# Altium footprint library mmyLibrary.PcbLib: 231 footprints (part 3 of 15)
Each footprint in its own frame and in the unit in brackets; x right, y up, seen from the top. Pads: shape width x height; smd on the part's side, far side on the other; paste and mask are expansions set on the pad; w line width, h text height; cw(c..) or ccw(c..) is an arc to the next point about the centre after c.
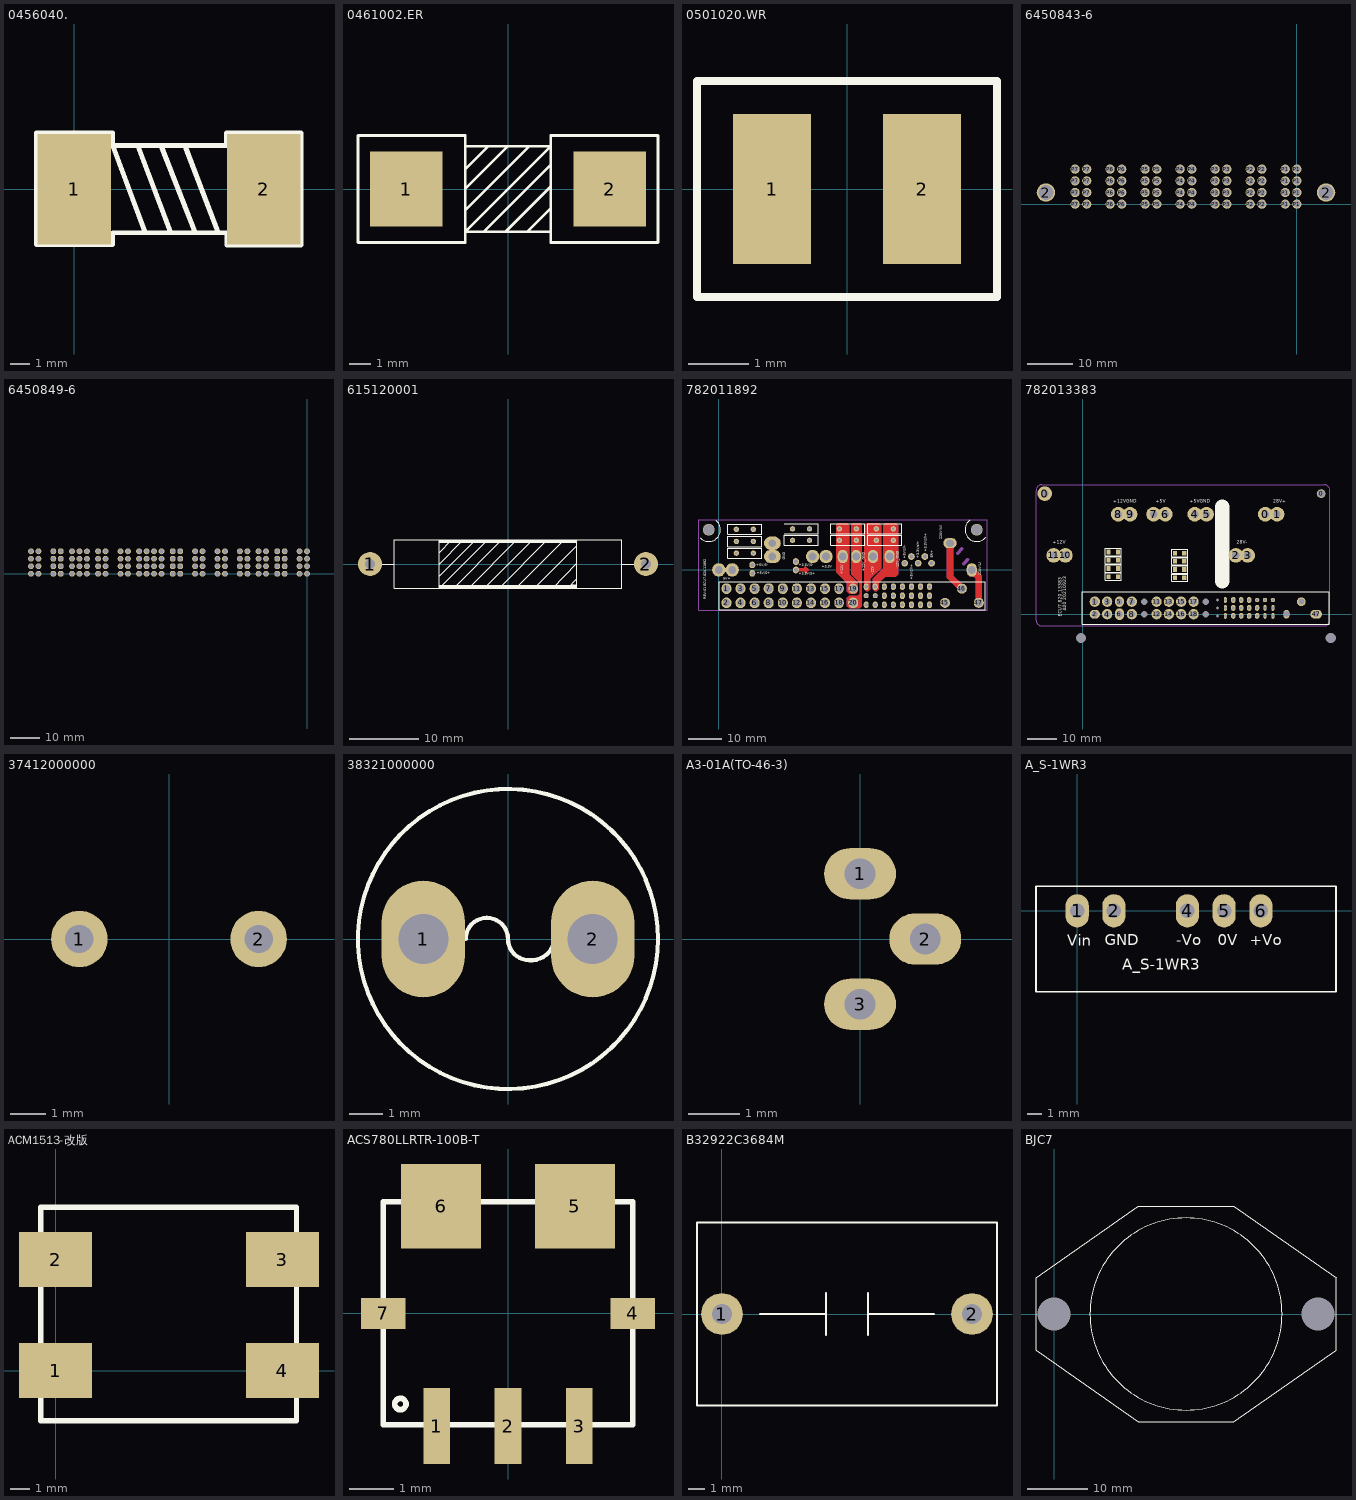
[diagram p2: the footprints below, top view; thin cyan lines are the x and y axes]

## 0456040. [mm]
pads (2):
  rect 3.8x5.7 smd: 1(0,0) 2(9.795,0)
Top Overlay:
  lines w0.254: 1.992,-2.268 1.992,-2.861 -1.958,-2.861 -1.958,2.916 1.992,2.916 1.992,2.25 ; 1.992,-2.25 7.447,-2.25 ; 3.285,2.25 4.981,-2.25 ; 3.679,-2.25 1.992,2.25 ; 4.485,2.25 6.252,-2.25 ; 5.774,2.105 7.447,-2.25 ; 1.992,2.25 7.861,2.25 7.861,2.916 11.718,2.916 11.718,-2.898 7.879,-2.898 7.879,-2.25 7.447,-2.25

## 0461002.ER [mm] "W10.1mm*L3.12mm*H3.12mm"
height 3.12
pads (2):
  rect 3.4x3.5 smd: 1(-4.75,0) 2(4.75,0)
Top Overlay:
  lines w0.127: -2,-1 1,2 ; -2,0 0,2 ; -2,0.9 -0.9,2 ; -2,2 2,2 -2,-2 2,-2 ; -1.143,-2 2,1.143 ; -0.127,-2 2,0.127 ; 0.889,-2 2,-0.889 ; -7,-2.5 -7,2.5 -2,2.5 -2,-2.5 -7,-2.5 ; 2,-2.5 2,2.5 7,2.5 7,-2.5 2,-2.5

## 0501020.WR [mm] "H3.2mm*W1.63mm*T0.835mm"
pads (2):
  rect 1.3x2.5 smd: 1(-1.25,0) 2(1.25,0)
Top Overlay:
  lines w0.127: -2.5,-1.8 -2.5,1.8 2.5,1.8 2.5,-1.8 -2.5,-1.8

## 6450843-6 [mm]
pads (58):
  round 4 hole 3.3: 2(-54.61,2.54) 2(6.35,2.54)
  round 2 hole 1.5: P1(-2.54,0) P1(-2.54,2.54) P1(-2.54,5.08) P1(-2.54,7.62) P1(0,0) P1(0,2.54) P1(0,5.08) P1(0,7.62) P2(-10.16,0) P2(-10.16,2.54) P2(-10.16,5.08) P2(-10.16,7.62) P2(-7.62,0) P2(-7.62,2.54) P2(-7.62,5.08) P2(-7.62,7.62) P3(-17.78,0) P3(-17.78,2.54) P3(-17.78,5.08) P3(-17.78,7.62) P3(-15.24,0) P3(-15.24,2.54) P3(-15.24,5.08) P3(-15.24,7.62) P4(-25.4,0) P4(-25.4,2.54) P4(-25.4,5.08) P4(-25.4,7.62) P4(-22.86,0) P4(-22.86,2.54) P4(-22.86,5.08) P4(-22.86,7.62) P5(-33.02,0) P5(-33.02,2.54) P5(-33.02,5.08) P5(-33.02,7.62) P5(-30.48,0) P5(-30.48,2.54) P5(-30.48,5.08) P5(-30.48,7.62) P6(-40.64,0) P6(-40.64,2.54) P6(-40.64,5.08) P6(-40.64,7.62) P6(-38.1,0) P6(-38.1,2.54) P6(-38.1,5.08) P6(-38.1,7.62) P7(-48.26,0) P7(-48.26,2.54) P7(-48.26,5.08) P7(-48.26,7.62) P7(-45.72,0) P7(-45.72,2.54) P7(-45.72,7.62) P7(-45.72,5.08)
Bottom Overlay:
  lines w0.254: -56.769,-5.08 -56.769,11.684 8.509,11.684 8.509,-5.08 -56.769,-5.08
  text "PCB" at 8.128,-4.572 h1.2

## 6450849-6 [mm]
pads (116):
  round 2 hole 1.5: 3(-80.01,2.54) 3(-80.01,5.08) 3(-77.47,2.54) 3(-77.47,5.08) 3(-74.93,2.54) 3(-74.93,5.08) 3(-57.15,2.54) 3(-57.15,5.08) 3(-54.61,2.54) 3(-54.61,5.08) 3(-52.07,2.54) 3(-52.07,5.08) 3(-49.53,2.54) 3(-49.53,5.08) 3(-16.51,2.54) 3(-16.51,5.08) 3(-13.97,2.54) 3(-13.97,5.08) A1(-13.97,0) A2(-16.51,0) A3(-49.53,0) A4(-52.07,0) A5(-54.61,0) A6(-57.15,0) A8(-77.47,0) A9(-80.01,0) D1(-13.97,7.62) D2(-16.51,7.62) D3(-49.53,7.62) D4(-52.07,7.62) D5(-54.61,7.62) D6(-57.15,7.62) D8(-77.47,7.62) D9(-80.01,7.62) P1(-2.54,0) P1(-2.54,2.54) P1(-2.54,5.08) P1(-2.54,7.62) P1(0,0) P1(0,2.54) P1(0,5.08) P1(0,7.62) P2(-10.16,0) P2(-10.16,2.54) P2(-10.16,5.08) P2(-10.16,7.62) P2(-7.62,0) P2(-7.62,2.54) P2(-7.62,5.08) P2(-7.62,7.62) P3(-22.86,0) P3(-22.86,2.54) P3(-22.86,5.08) P3(-22.86,7.62) P3(-20.32,0) P3(-20.32,2.54) P3(-20.32,5.08) P3(-20.32,7.62) P4(-30.48,0) P4(-30.48,2.54) P4(-30.48,5.08) P4(-30.48,7.62) P4(-27.94,0) P4(-27.94,2.54) P4(-27.94,5.08) P4(-27.94,7.62) P5(-38.1,0) P5(-38.1,2.54) P5(-38.1,5.08) P5(-38.1,7.62) P5(-35.56,0) P5(-35.56,2.54) P5(-35.56,5.08) P5(-35.56,7.62) P6(-45.72,0) P6(-45.72,2.54) P6(-45.72,5.08) P6(-45.72,7.62) P6(-43.18,0) P6(-43.18,2.54) P6(-43.18,5.08) P6(-43.18,7.62) P7(-63.5,0) P7(-63.5,2.54) P7(-63.5,5.08) P7(-63.5,7.62) P7(-60.96,0) P7(-60.96,2.54) P7(-60.96,5.08) P7(-60.96,7.62) P8(-71.12,0) P8(-71.12,2.54) P8(-71.12,5.08) P8(-71.12,7.62) P8(-68.58,0) P8(-68.58,2.54) P8(-68.58,5.08) P8(-68.58,7.62) P9(-86.36,5.08) P9(-86.36,0) P9(-86.36,2.54) P9(-86.36,7.62) P9(-83.82,0) P9(-83.82,2.54) P9(-83.82,5.08) P9(-83.82,7.62) P10(-93.98,5.08) P10(-93.98,7.62) P10(-93.98,0) P10(-93.98,2.54) P10(-91.44,2.54) P10(-91.44,5.08) P10(-91.44,0) P10(-91.44,7.62)
  oval 2x1.8 hole 1.5: A7(-74.93,0) D7(-74.93,7.62)
Bottom Overlay:
  lines w0.254: -98.044,-5.08 -98.044,11.684 4.064,11.684 4.064,-5.08 -98.044,-5.08
  text "P1" at -0.46,10.8 h1.5
  text "PCB" at 3.556,-4.572 h1.2

## 615120001 [mm] "6.35*32.5mm"
height 6.35
pads (2):
  round 3.5 hole 1.5: 1(-20,0) 2(20,0)
Top Overlay:
  rectangle: -10,-3.5 10,-3.048
  rectangle: 9.147,-3.5 10,-2.998
  rectangle: -10.033,3.048 10,3.5
  lines w0.127: -20,0 -16.5,0 ; -10,-1.778 -4.699,3.5 ; -10,0 -6.477,3.5 ; -10,1.651 -8.128,3.5 ; -10,3.373 -10,-3.5 -2.921,3.5 ; -7.874,-3.5 -0.889,3.5 ; -5.715,-3.5 1.27,3.5 ; -3.429,-3.5 3.556,3.5 ; -1.27,-3.5 5.715,3.5 ; 1.143,-3.5 8.128,3.5 ; 3.81,-3.5 10,2.667 ; 6.477,-3.5 10,0.127 ; 8.636,-3.5 10,-2.159 ; 10,-3.5 10,3.5 ; 16.5,0 20,0 ; -16.5,-3.5 -16.5,3.5 16.5,3.5 16.5,-3.5 -16.5,-3.5

## 782011892 [mm]
pads (88):
  oval 3x3.2 hole 2.2: 1(2.3,-5.58) 2(2.3,-9.83) 3(6.5,-5.58) 4(6.5,-9.83) 5(10.7,-5.58) 6(10.7,-9.83) 7(14.9,-5.58) 8(14.9,-9.83) 9(19.1,-5.58) 10(19.1,-9.83) 11(23.3,-5.58) 12(23.3,-9.83) 13(27.5,-5.58) 14(27.5,-9.83) 15(31.7,-5.58) 16(31.7,-9.83) 20(40.1,-9.83)
  round 1.6 hole 0.8: 1(10.325,5.015) 1(10.325,8.507) 1(10.325,12.127) 1(22.009,8.825) 1(22.009,12.254) 1(35.979,8.825) 1(35.979,12.254) 1(47.028,8.825) 1(47.028,12.254) 2(5.245,5.015) 2(5.245,8.507) 2(5.245,12.127) 2(27.089,8.825) 2(27.089,12.254) 2(41.059,8.825) 2(41.059,12.254) 2(52.108,8.825) 2(52.108,12.254)
  oval 2.8x3.2 hole 2.2: 17(35.9,-5.58) 18(35.9,-9.83)
  oval 2.8x3 hole 2.2: 19(40.1,-5.58)
  oval 1.5x2 hole 1: 21(44,-5) 23(44,-10.4) 24(46.7,-5) 26(46.7,-10.4) 27(49.4,-5) 28(49.4,-7.7) 29(49.4,-10.4) 30(52.1,-5) 31(52.1,-7.7) 32(52.1,-10.4) 33(54.8,-5) 34(54.8,-7.7) 35(54.8,-10.4) 36(57.5,-5) 37(57.5,-7.7) 38(57.5,-10.4) 39(60.2,-5) 40(60.2,-7.7) 41(60.2,-10.4) 42(62.9,-5) 43(62.9,-7.7) 44(62.9,-10.4)
  round 1.5 hole 1: 22(44,-7.7) 25(46.7,-7.7)
  round 3 hole 2.2: 45(67.5,-9.83) 46(72.55,-5.58) 47(77.6,-9.83)
  round 3.5 hole 3.2: ""(-3,12) ""(77,12)
  round 4 hole 2.3: ""(0,0) ""(4,0) ""(28,4) ""(32,4)
  oval 1.8x2 hole 1.2: ""(10,-1) ""(10,1.5) ""(23,0) ""(23,2.5)
  oval 5x4 hole 2.3: ""(16,4) ""(16,8)
  oval 3x4 hole 2.3: ""(37,4) ""(46,4) ""(51,4) ""(75.5,0)
  oval 2.8x4 hole 2.3: ""(41,4)
  round 2 hole 1.2: ""(55.5,2) ""(57.5,4) ""(59.5,2) ""(61.5,4) ""(63.5,2)
  oval 4x3 hole 2.3: ""(69,8)
Top Layer:
  region: 26.454,-0.75 25.556,0.148 25.107,-0.301 26.005,-1.199
  region: 25.413,-0.217 26.311,0.681 25.862,1.13 24.964,0.232
  region: 42.71,13.27 42.71,-10.86 42.075,-11.495 38.9,-11.495 38.265,-10.86 38.265,-8.32 38.9,-7.685 41.44,-7.685 42.075,-7.05 42.075,-3.875 39.535,-1.335 39.535,13.27 40.17,13.905 42.075,13.905
  region: 53.505,13.27 53.505,-1.335 52.87,-1.97 49.695,-1.97 47.79,-3.875 47.79,-5.78 47.155,-6.415 46.52,-6.415 45.885,-5.78 45.885,-2.605 49.06,0.57 49.06,13.27 49.695,13.905 52.87,13.905
  region: 38.9,13.27 38.9,-1.335 41.44,-3.875 41.44,-6.415 40.805,-7.05 38.9,-7.05 38.265,-6.415 38.265,-3.875 35.09,-0.7 35.09,13.27 35.725,13.905 38.265,13.905
  region: 48.425,13.27 48.425,0.57 45.25,-2.605 45.25,-5.78 44.615,-6.415 43.98,-6.415 43.345,-5.78 43.345,13.27 43.98,13.905 47.79,13.905
  lines w1: 23,0 26.491,0
  lines w2: 70,8 68.999,6.999 68.999,-2.029 72.55,-5.58 ; 75.5,-1 cw(c75.5,-3.414) 77.207,-1.707 ; 75.5,0 77.6,-2.1 77.6,-9.83
Mid-Layer 1:
  region: 24.808,-2.864 25.252,-2.419 24.803,-1.97 24.359,-2.415
  region: 42.71,-8.32 42.71,-10.86 42.075,-11.495 38.9,-11.495 38.265,-10.86 38.265,-8.32 38.9,-7.685 42.075,-7.685
  region: 41.44,-4.51 41.44,-6.415 40.805,-7.05 38.9,-7.05 38.265,-6.415 38.265,-4.51 38.9,-3.875 40.805,-3.875
  region: 53.505,13.27 53.505,-1.335 52.87,-1.97 49.695,-1.97 47.79,-3.875 47.79,-5.78 47.155,-6.415 46.52,-6.415 45.885,-5.78 45.885,-2.605 49.06,0.57 49.06,13.27 49.695,13.905 52.87,13.905
  region: 42.71,13.27 42.71,-0.7 42.075,-1.335 40.17,-1.335 39.535,-0.7 39.535,13.27 40.17,13.905 42.075,13.905
  region: 38.9,13.27 38.9,-0.7 38.265,-1.335 35.725,-1.335 35.09,-0.7 35.09,13.27 35.725,13.905 38.265,13.905
  region: 48.425,13.27 48.425,0.57 45.25,-2.605 45.25,-5.78 44.615,-6.415 43.98,-6.415 43.345,-5.78 43.345,13.27 43.98,13.905 47.79,13.905
  lines w0.5: 24.168,-2.224 40.78,-2.224 42.456,-3.9 42.456,-6.156 44,-7.7
  lines w1: 66.793,-9.123 ccw(c65.086,-7.416) 67.5,-7.416 ccw(c69.914,-7.416) 68.207,-9.123 ; 67.5,-9.83 67.5,-1.31 77,8.19 77,12 ; 76.116,11.116 cw(c73.982,8.982) 77,8.982 cw(c80.018,8.982) 77.884,11.116
Mid-Layer 2:
  region: 53.505,13.27 53.505,0.855 53.104,0.454 52.982,0.272 52.939,0.057 52.939,-1.901 52.87,-1.97 49.695,-1.97 47.79,-3.875 47.79,-5.78 47.155,-6.415 46.52,-6.415 45.885,-5.78 45.885,-2.605 49.06,0.57 49.06,13.27 49.695,13.905 52.87,13.905
  region: 42.71,13.27 42.71,-10.86 42.075,-11.495 38.9,-11.495 38.265,-10.86 38.265,-8.32 38.9,-7.685 41.44,-7.685 42.075,-7.05 42.075,-3.875 39.535,-1.335 39.535,13.27 40.17,13.905 42.075,13.905
  region: 38.9,13.27 38.9,-1.335 41.44,-3.875 41.44,-6.415 40.805,-7.05 38.9,-7.05 38.265,-6.415 38.265,-3.875 35.09,-0.7 35.09,13.27 35.725,13.905 38.265,13.905
  region: 48.425,13.27 48.425,0.57 45.25,-2.605 45.25,-5.78 44.615,-6.415 43.98,-6.415 43.345,-5.78 43.345,13.27 43.98,13.905 47.79,13.905
  lines w0.5: 53.52,-6.42 ccw(c54.8,-5.139) 54.8,-6.95 ; 54.122,0.679 cw(c55.5,-0.698) 55.5,1.25 ; 54.123,-7.023 cw(c53.697,-7.45) 54.3,-7.45 ; 54.26,0.817 ccw(c53.077,2) 54.75,2 ; 54.8,-10.4 56.172,-9.028 56.172,-2.097 57.442,-0.827 57.442,3.558 57,4 ; 54.8,-9.65 ccw(c54.8,-7.839) 56.08,-9.12 ; 54.8,-7.7 53.5,-6.4 53.5,0.057 55.471,2.028 ; 55.3,-10.15 cw(c55.904,-10.15) 55.477,-9.723 ; 56.97,3.47 cw(c55.829,2.329) 57.442,2.329 ; 57.442,2.049 cw(c59.451,2.049) 58.03,3.47 ; 58.839,-1.406 cw(c62.906,-1.406) 60.03,1.47 ; 58.839,-0.199 cw(c61.699,-0.199) 59.677,1.823 ; 58.839,1.008 cw(c60.492,1.008) 59.323,2.177 ; 58.92,-6.42 ccw(c60.2,-5.139) 60.2,-6.95 ; 59.5,2 58.839,1.339 58.839,-6.339 60.2,-7.7 ; 59.523,-7.023 cw(c59.097,-7.45) 59.7,-7.45 ; 60.2,-10.4 61.5,-9.1 61.5,4 ; 60.2,-9.65 ccw(c60.2,-7.839) 61.48,-9.12 ; 60.7,-10.15 cw(c61.304,-10.15) 60.877,-9.723 ; 60.97,3.47 cw(c59.689,2.189) 61.5,2.189 cw(c63.311,2.189) 62.03,3.47 ; 61.5,4 61.5,4
  lines w1: 62.723,-4.573 ccw(c60.848,-2.698) 63.5,-2.698 ; 62.9,-5 63.5,-4.4 63.5,2 ; 63.146,1.646 cw(c62.293,0.793) 63.5,0.793 cw(c64.707,0.793) 63.854,1.646
  lines w2: 70,8 68.999,6.999 68.999,-2.029 72.55,-5.58 ; 75.5,-1 cw(c75.5,-3.414) 77.207,-1.707 ; 75.5,0 77.6,-2.1 77.6,-9.83
Bottom Layer:
  region: 53.505,13.27 53.505,-1.335 52.87,-1.97 49.695,-1.97 47.79,-3.875 47.79,-5.78 47.155,-6.415 46.52,-6.415 45.885,-5.78 45.885,-2.605 49.06,0.57 49.06,13.27 49.695,13.905 52.87,13.905
  region: 42.71,13.27 42.71,-10.86 42.075,-11.495 38.9,-11.495 38.265,-10.86 38.265,-8.32 38.9,-7.685 41.44,-7.685 42.075,-7.05 42.075,-3.875 39.535,-1.335 39.535,13.27 40.17,13.905 42.075,13.905
  region: 38.9,13.27 38.9,-1.335 41.44,-3.875 41.44,-6.415 40.805,-7.05 38.9,-7.05 38.265,-6.415 38.265,-3.875 35.09,-0.7 35.09,13.27 35.725,13.905 38.265,13.905
  region: 48.425,13.27 48.425,0.57 45.25,-2.605 45.25,-5.78 44.615,-6.415 43.98,-6.415 43.345,-5.78 43.345,13.27 43.98,13.905 47.79,13.905
  lines w2: 70,8 68.999,6.999 68.999,-2.029 72.55,-5.58 ; 75.5,-1 cw(c75.5,-3.414) 77.207,-1.707 ; 75.5,0 77.6,-2.1 77.6,-9.83
Top Overlay:
  lines w0.254: -5.559,9.612 ccw(c-3,12) -0.718,14.654 ; 19.469,10.73 29.629,10.73 29.629,13.778 19.469,13.778 ; 74.941,14.831 ccw(c77,12) 79.733,9.814 ; 0.095,-11.93 0.095,-3.48 79.47,-3.48 79.47,-11.93 40.1,-11.93 36.29,-11.93 0.095,-11.93 ; 2.705,3.491 12.865,3.491 12.865,6.539 2.705,6.539 2.705,3.491 ; 2.705,6.983 12.865,6.983 12.865,10.031 2.705,10.031 2.705,6.983 ; 2.705,10.603 12.865,10.603 12.865,13.651 2.705,13.651 2.705,10.603 ; 19.469,7.301 29.629,7.301 29.629,10.349 19.469,10.349 19.469,7.301 ; 33.439,7.301 43.599,7.301 43.599,10.349 33.439,10.349 33.439,7.301 ; 33.439,10.73 43.599,10.73 43.599,13.778 33.439,13.778 33.439,10.73 ; 44.488,7.301 54.648,7.301 54.648,10.349 44.488,10.349 44.488,7.301 ; 44.488,10.73 54.648,10.73 54.648,13.778 44.488,13.778 44.488,10.73
  text "+5V/sh+" at 57.823,-2.884 h0.8
  text "+3.3V/sh+" at 62.014,5.371 h0.8
  text "+5V/sh-" at 55.791,3.339 h0.8
  text "+3.3V/sh-" at 59.855,3.466 h0.8
  text "+3.3V/S+" at 23.914,-1.487 h0.8
  text "+3.3V/S-" at 23.914,1.053 h0.8
  text "+5V/S-" at 11.214,1.053 h0.8
  text "+5V/S+" at 11.341,-1.36 h0.8
  text "REV:01 ECU7.820.11892" at -3.772,-8.726 h0.8
  text "-12V_GND" at 53.759,0.291 h0.8
  text "-12V" at 46.266,-1.36 h0.8
  text "+12V_GND" at 43.599,-0.344 h0.8
  text "+12V" at 37.122,-1.36 h0.8
  text "+3.3V" at 30.772,0.672 h0.8
  text "GND" at 19.85,3.085 h0.8
  text "5V+" at 1.308,-2.884 h0.8
  text "ER+" at 64.046,3.593 h0.8
  text "220V(N)" at 66.713,9.181 h0.8
  text "220V(L)" at 78.27,-1.614 h0.8
Bottom Overlay:
  text "ECU7.820.11892" at -3.772,7.149 h0.8
Bottom Solder:
  rectangle: 42.075,-7.964 42.71,-3.265
Mechanical 1:
  lines w0.254: -5.947,-11.964 -5.947,15.036 80.053,15.036 80.053,-11.964 -5.947,-11.964
  lines w1: 71.285,5.015 72.555,6.285 ; 73.063,1.84 74.333,3.11

## 782013383 [mm]
pads (79):
  round 5 hole 2.5: 0(-12.9,41) 0(62.1,34) 1(66.1,34) 2(52.1,20) 3(56.1,20) 4(38.1,34) 5(42.1,34) 6(28.1,34) 7(24.1,34) 8(12.1,34) 9(16.1,34) 10(-5.9,20) 11(-9.9,20)
  round 0 hole 3.5: 0(-0.6,-8.12) 0(84.4,-8.12)
  round 3 hole 2.5: 0(81.1,41)
  round 3.5 hole 2.2: 1(4.1,4.25) 3(8.3,4.25) 4(8.3,0) 7(16.705,4.25) 8(16.705,0) 11(25.1,4.25) 12(25.1,0) 13(29.3,4.25) 14(29.3,0) 15(33.5,4.25) 16(33.5,0) 17(37.7,4.25) 18(37.7,0)
  rect 1.4x1.6 smd: 1(8.731,12.771) 1(8.731,15.565) 1(8.731,18.359) 1(8.731,21.153) 1(31.337,12.39) 1(31.337,15.184) 1(31.337,17.978) 1(31.337,20.772) 2(11.931,12.771) 2(11.931,15.565) 2(11.931,18.359) 2(11.931,21.153) 2(34.537,12.39) 2(34.537,15.184) 2(34.537,17.978) 2(34.537,20.772)
  oval 3.5x3 hole 2.2: 2(4.1,0)
  oval 3x3.5 hole 2.2: 5(12.5,4.25)
  oval 3x4 hole 2.2: 6(12.5,0)
  round 0 hole 2.2: 9(20.9,4.25) 10(20.9,0) 19(41.9,4.25) 20(41.9,0)
  round 0 hole 1: 21(45.8,4.825) 22(45.8,2.125) 23(45.8,-0.575)
  oval 1x2 hole 1: 24(48.5,4.825) 25(48.5,2.125) 26(48.5,-0.575) 40(62,2.125) 41(62,-0.575) 43(64.7,2.125) 44(64.7,-0.575)
  oval 1.5x2 hole 1: 27(51.2,4.825) 28(51.2,2.125) 29(51.2,-0.575) 30(53.9,4.825) 31(53.9,2.125) 32(53.9,-0.575) 33(56.6,4.825) 34(56.6,2.125) 35(56.6,-0.575) 37(59.3,2.125) 38(59.3,-0.575)
  round 1.5 hole 1: 36(59.3,4.825) 39(62,4.825) 42(64.7,4.825)
  oval 2x3 hole 2: 45(69.3,0)
  round 3 hole 2: 46(74.35,4.25)
  oval 4x3 hole 2: 47(79.4,0)
via 4.1,0 diameter 1.2 hole 0.6
Top Overlay:
  lines w0.2: 8.711,14.021 11.271,14.021 ; 8.711,16.815 11.271,16.815 ; 8.711,19.609 11.271,19.609 ; 8.711,22.403 11.271,22.403 ; 9.631,14.021 7.631,14.021 7.631,11.521 9.631,11.521 11.221,11.521 ; 9.631,16.815 7.631,16.815 7.631,14.315 9.631,14.315 11.221,14.315 ; 9.631,19.609 7.631,19.609 7.631,17.109 9.631,17.109 11.221,17.109 ; 9.631,22.403 7.631,22.403 7.631,19.903 9.631,19.903 11.221,19.903 ; 11.031,11.521 13.031,11.521 13.031,14.021 11.031,14.021 ; 11.031,14.315 13.031,14.315 13.031,16.815 11.031,16.815 ; 11.031,17.109 13.031,17.109 13.031,19.609 11.031,19.609 ; 11.031,19.903 13.031,19.903 13.031,22.403 11.031,22.403 ; 31.317,13.64 33.877,13.64 ; 31.317,16.434 33.877,16.434 ; 31.317,19.228 33.877,19.228 ; 31.317,22.022 33.877,22.022 ; 32.237,13.64 30.237,13.64 30.237,11.14 32.237,11.14 33.827,11.14 ; 32.237,16.434 30.237,16.434 30.237,13.934 32.237,13.934 33.827,13.934 ; 32.237,19.228 30.237,19.228 30.237,16.728 32.237,16.728 33.827,16.728 ; 32.237,22.022 30.237,22.022 30.237,19.522 32.237,19.522 33.827,19.522 ; 33.637,11.14 35.637,11.14 35.637,13.64 33.637,13.64 ; 33.637,13.934 35.637,13.934 35.637,16.434 33.637,16.434 ; 33.637,16.728 35.637,16.728 35.637,19.228 33.637,19.228 ; 33.637,19.522 35.637,19.522 35.637,22.022 33.637,22.022 ; -0.163,-3.416 83.937,-3.416 83.937,7.684 -0.163,7.684 -0.163,-3.416
  lines w5: 47.407,11.303 47.407,36.449
  text "28V+" at 64.806,37.465 h2
  text "28V-" at 52.36,23.495 h2
  text "+5VGND" at 36.485,37.465 h2
  text "+5V" at 24.801,37.465 h2
  text "+12VGND" at 10.323,37.465 h2
  text "+12V" at -10.124,23.495 h2
  text "ECU7.820.13383" at -6.687,-0.945 h2
  text "A00 20210923" at -5.036,1.087 h2
Bottom Overlay:
  text "M." at 81.57,37.084 h1
  text "A00 20210923" at -5.036,11.882 h2
  text "ECU7.820.13383" at -6.687,12.009 h2
Mechanical 1:
  lines w0.2: -15.9,-2.088 -15.9,42 cw(c-13.9,42) -13.9,44 82.1,44 cw(c82.1,42) 84.1,42 84.1,-2 cw(c82.1,-2) 82.1,-4 -13.9,-4 cw(c-13.9,-2) -15.9,-2

## 37412000000 [mm]
pads (2):
  round 1.6 hole 0.8: 1(-2.54,0) 2(2.54,0)
Bottom Overlay:
  circle w0.254: c0,0 r4.25
  lines w0.254: -1.545,0 cw(c-0.773,0) 0,0 ccw(c0.773,0) 1.545,0

## 38321000000 [mm] "D8.5*H8"
height 8
pads (2):
  oval 2.5x3.5 hole 1.5: 1(-2.54,0) 2(2.54,0)
Top Overlay:
  circle w0.127: c0,0 r4.5
  lines w0.127: -1.27,0 cw(c-0.635,0) -0.635,0.635 cw(c-0.635,0) 0,0 ccw(c0.635,0) 0.635,-0.635 ccw(c0.699,0.064) 1.397,0

## A3-01A(TO-46-3) [mm]
pads (3):
  oval 1.4x1 hole 0.6: 1(0,1.27) 2(1.27,0) 3(0,-1.27)
Bottom Overlay:
  lines w0.127: -0.716,-0.696 0.462,0.188 ; -0.381,0.635 -0.381,-0.127 ; -0.127,0.127 0.254,-0.381 ; -0.381,-0.127 0.042,-0.127 0,-0.508 -0.381,-0.127
  lines w0.254: -2.555,0.766 ccw(c0,0) -1.479,2.219 -2.032,2.667 -3.175,1.27 -2.54,0.762

## A_S-1WR3 [mm]
pads (5):
  oval 1.6x2.3 hole 1: 1(0,0) 2(2.54,0) 4(7.62,0) 5(10.16,0) 6(12.7,0)
Top Overlay:
  lines w0.127: -2.85,-5.6 17.9,-5.6 17.9,1.7 -2.85,1.7 -2.85,-5.6
  text "A_S-1WR3" at 3.126,-4.069 h0.76
  text "+Vo" at 11.946,-2.377 h0.76
  text "GND" at 1.897,-2.377 h0.76
  text "Vin" at -0.704,-2.413 h0.76
  text "-Vo" at 6.866,-2.377 h0.76
  text "0V" at 9.73,-2.377 h0.76
3D body "A05_S-1WR3.stp": height 10.16, standoff -4.1, extent -2.459,-5.159 17.191,0.841

## ACM1513-改版 [mm] "原封装引脚错了-改版将引脚更改"
pads (4):
  rect 3.7x2.8 smd: 1(0,0) 2(0,5.611) 3(11.468,5.611) 4(11.468,0)
Top Overlay:
  lines w0.254: -0.75,-2.54 -0.75,8.255 12.192,8.255 12.192,-2.54 -0.75,-2.54
3D body "User Library-acm1513.STEP": height 5.87, standoff 0.37, extent -1.785,-3.602 13.215,9.398

## ACS780LLRTR-100B-T [mm]
pads (7):
  rect 0.6x1.7 smd: 1(-1.6,-2.527) 2(0,-2.527) 3(1.6,-2.527)
  rect 1x0.7 smd: 4(2.8,0) 7(-2.8,0)
  rect 1.8x1.9 smd: 5(1.5,2.4) 6(-1.5,2.4)
Top Overlay:
  circle w0.127: c-2.413,-2.032 r0.127
  lines w0.127: -2.8,-2.5 2.8,-2.5 2.8,2.5 -2.8,2.5 -2.8,-2.5

## B32922C3684M [mm] "X容/11*18.5*18"
height 18
pads (2):
  round 2.5 hole 1.2: 1(0,0) 2(15,0)
Top Overlay:
  lines w0.127: 2.293,0 6.23,0 ; 6.23,-1.27 6.23,1.27 ; 8.77,-1.27 8.77,1.27 ; 8.77,0 12.707,0 ; -1.5,-5.5 -1.5,5.5 16.5,5.5 16.5,-5.5 -1.5,-5.5

## BJC7 [mm] "浙江百事宝，接触器"
height 46
pads (2):
  round 0 hole 5.5: 0(0,0) 0(44,0)
Top Overlay:
  circle w0.127: c22,0 r16
  lines w0.127: -3,-6 -3,6 14,18 30,18 47,6 47,-6 30,-18 14,-18 -3,-6